# Altium footprint library SWLIB(150721).PcbLib: 348 footprints (part 17 of 22)
Each footprint in its own frame and in the unit in brackets; x right, y up, seen from the top. Pads: shape width x height; smd on the part's side, far side on the other; paste and mask are expansions set on the pad; w line width, h text height; cw(c..) or ccw(c..) is an arc to the next point about the centre after c.
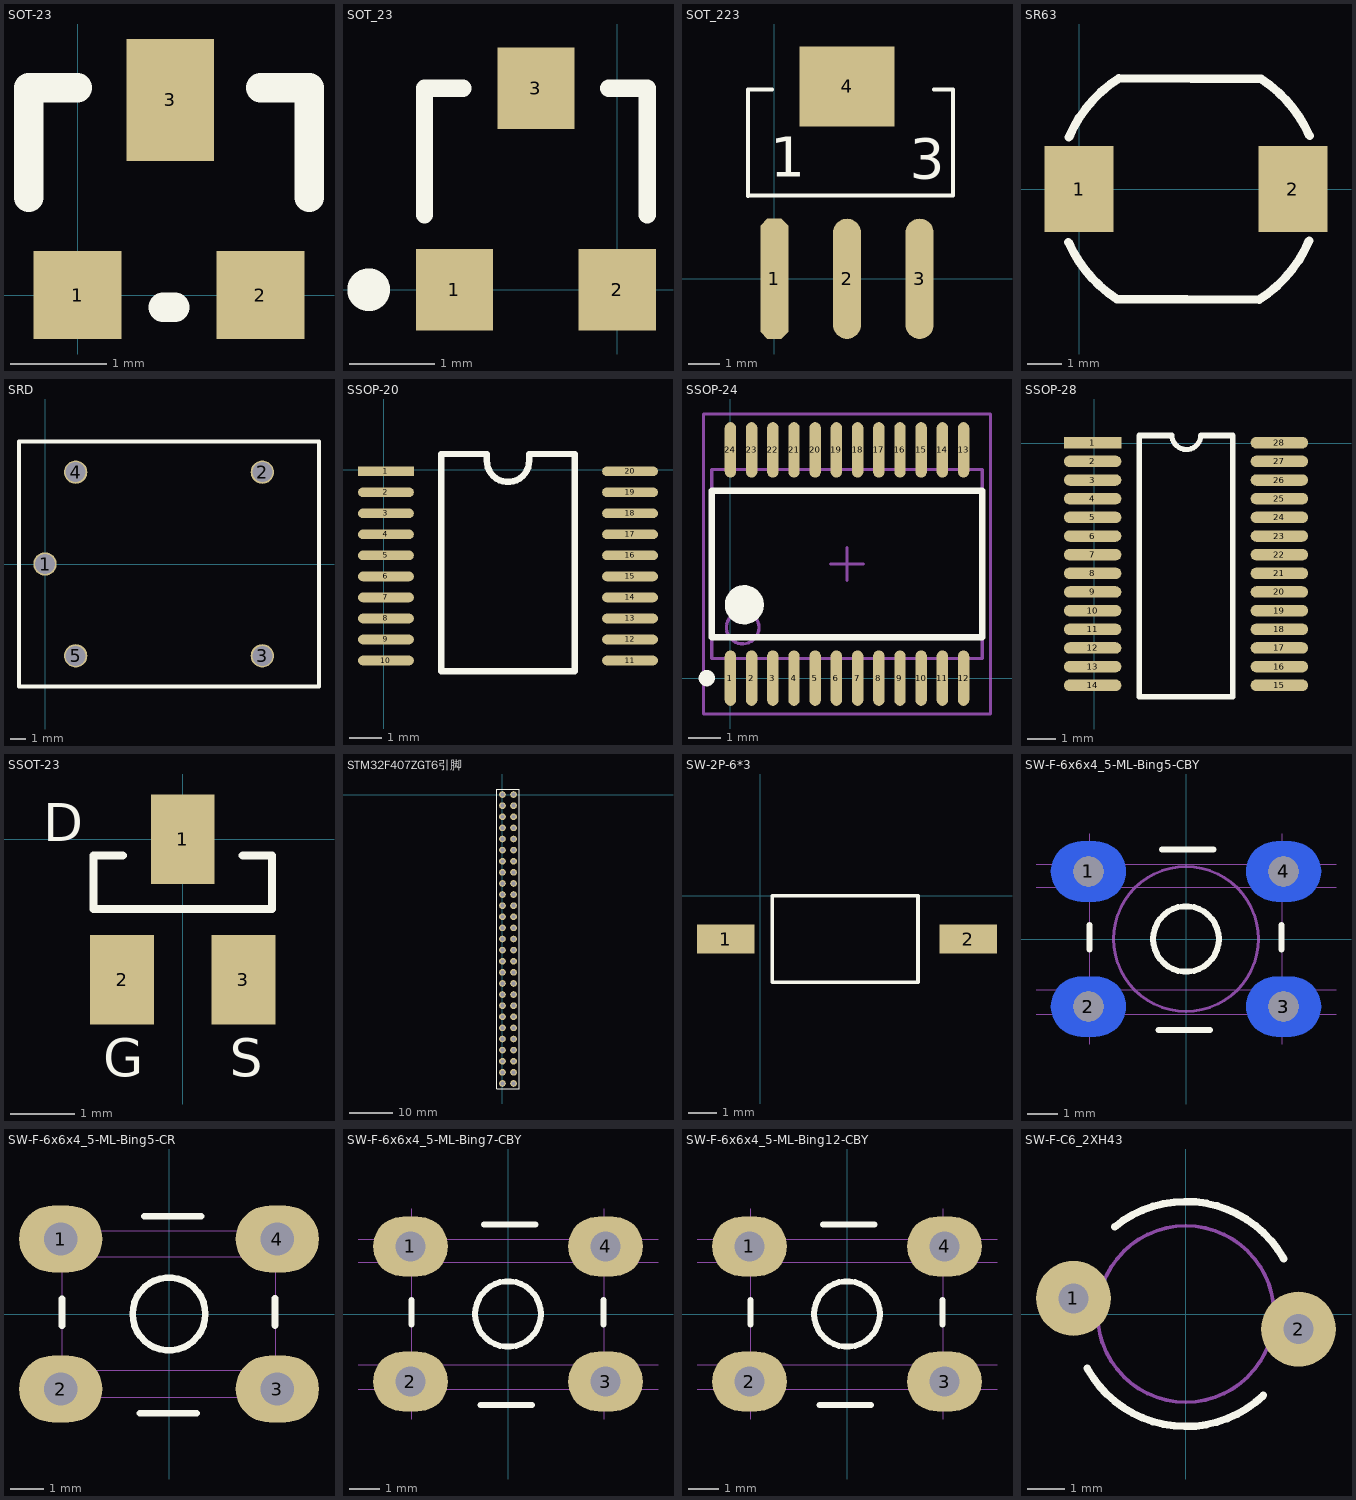
[diagram p16: the footprints below, top view; thin cyan lines are the x and y axes]

## SOT-23 [mil]
pads (3):
  rect 36x36 smd: 1(0,0) 2(75,0)
  rect 36x50 smd: 3(38,80)
Top Overlay:
  lines w12: -20,40 -20,85 0,85 ; 35,-5 40,-5 ; 75,85 95,85 95,40

## SOT_23 [mm]
pads (3):
  rect 0.9x0.95 smd: 1(-1.9,0) 2(0,0) 3(-0.95,2.35)
Top Overlay:
  circle w0.25: c-2.9,0 r0.125
  lines w0.2: -2.25,0.875 -2.25,2.35 -1.8,2.35 ; -0.1,2.35 0.35,2.35 0.35,0.875
3D body "SOT-23-3.STEP": height 1.2, standoff 0, extent -2.428,-0.193 0.472,2.607

## SOT_223 [mm]
pads (4):
  oct 0.889x3.81 smd: 1(0,0)
  oval 0.889x3.81 smd: 2(2.3,0) 3(4.6,0)
  rect 3x2.54 smd: 4(2.3,6.096)
Top Overlay:
  lines w0.127: -0.076,5.994 -0.838,5.994 -0.838,2.616 -0.813,2.642 5.664,2.642 5.664,5.994 5.055,5.994
  text "3" at 4.293,3.175 h1.27
  text "1" at -0.127,3.226 h1.27
3D body "SOT-223_MP04A.STEP": height 1.7, standoff 0, extent -0.837,0.203 5.663,7.163

## SR63 [mil]
pads (2):
  rect 80x100 smd: 1(0,0) 2(248.03,0)
Top Overlay:
  lines w10: -12.42,-61.6 ccw(c126.88,0) 43.69,-127.59 208.93,-128.33 ccw(c126.88,0) 266.88,-60 ; -11.88,60 cw(c128.12,0) 46.07,128.33 211.31,127.59 cw(c128.12,0) 267.42,61.6

## SRD [mm]
pads (5):
  round 1.524 hole 1.3: 1(0,0) 2(14.2,6) 3(14.2,-6) 4(2,6) 5(2,-6)
Top Overlay:
  lines w0.254: -1.7,-8 -1.7,8 17.9,8 17.9,-8 -1.7,-8

## SSOP-20 [mil]
pads (20):
  rect 68x11.81 smd: 1(2.91,-2.05)
  oval 68x11.81 smd: 2(2.91,-27.64) 3(2.91,-53.23) 4(2.91,-78.82) 5(2.91,-104.41) 6(2.91,-130) 7(2.91,-155.59) 8(2.91,-181.18) 9(2.91,-206.77) 10(2.91,-232.36) 11(300,-232.36) 12(300,-206.77) 13(300,-181.18) 14(300,-155.59) 15(300,-130) 16(300,-104.41) 17(300,-78.82) 18(300,-53.23) 19(300,-27.64) 20(300,-2.05)
Top Overlay:
  lines w7.87: 70.16,-245.16 70.16,18.95 125.66,18.95 125.66,10.75 ccw(c151.46,10.75) 177.26,10.75 177.26,18.95 232.76,18.95 232.76,-245.16 70.16,-245.16
3D body "SSOP-20.STEP": height 70.47, standoff -1.97, extent -2.59,-258.74 308.43,28.66

## SSOP-24 [mm]
pads (24):
  oval 0.35x1.7 smd: 1(0,0) 2(0.65,0) 3(1.3,0) 4(1.95,0) 5(2.6,0) 6(3.25,0) 7(3.9,0) 8(4.55,0) 9(5.2,0) 10(5.85,0) 11(6.5,0) 12(7.15,0) 13(7.15,7) 14(6.5,7) 15(5.85,7) 16(5.2,7) 17(4.55,7) 18(3.9,7) 19(3.25,7) 20(2.6,7) 21(1.95,7) 22(1.3,7) 23(0.65,7) 24(0,7)
Top Overlay:
  circle w0.6: c0.425,2.25 r0.3
  circle w0.25: c-0.725,0 r0.125
  lines w0.2: -0.575,1.25 -0.575,5.75 7.725,5.75 7.725,1.25 -0.575,1.25
Mechanical 13:
  circle w0.1: c0.375,1.55 r0.5
  lines w0.1: -0.575,0.6 -0.575,6.4 7.725,6.4 7.725,0.6 -0.575,0.6
Mechanical 15:
  lines w0.1: 3.075,3.5 4.075,3.5 ; 3.575,3 3.575,4 ; -0.825,-1.1 -0.825,8.1 7.975,8.1 7.975,-1.1 -0.825,-1.1
3D body: height 1.6, standoff 0.15, extent -0.575,0.6 7.725,6.4

## SSOP-28 [mm]
pads (28):
  rect 2x0.4 smd: 1(-0.051,0.025)
  oval 2x0.4 smd: 2(-0.051,-0.625) 3(-0.051,-1.275) 4(-0.051,-1.925) 5(-0.051,-2.575) 6(-0.051,-3.225) 7(-0.051,-3.875) 8(-0.051,-4.525) 9(-0.051,-5.175) 10(-0.051,-5.825) 11(-0.051,-6.475) 12(-0.051,-7.125) 13(-0.051,-7.775) 14(-0.051,-8.425) 15(6.451,-8.425) 16(6.451,-7.775) 17(6.451,-7.125) 18(6.451,-6.475) 19(6.451,-5.825) 20(6.451,-5.175) 21(6.451,-4.525) 22(6.451,-3.875) 23(6.451,-3.225) 24(6.451,-2.575) 25(6.451,-1.925) 26(6.451,-1.275) 27(6.451,-0.625) 28(6.451,0.025)
Top Overlay:
  lines w0.178: 2.705,0.296 ccw(c3.213,0.296) 3.72,0.282
  lines w0.2: 2.705,0.274 1.575,0.274 1.575,-8.826 4.826,-8.826 4.826,0.274 3.72,0.274

## SSOT-23 [mm]
pads (3):
  rect 1x1.4 smd: 1(0,0) 2(-0.95,-2.2) 3(0.95,-2.2)
Top Overlay:
  lines w0.127: -0.94,-0.254 -1.397,-0.254 -1.397,-1.092 1.397,-1.092 1.397,-0.254 0.94,-0.254
  text "D" at -2.184,-0.229 h1.02
  text "G" at -1.245,-3.912 h1.02
  text "S" at 0.737,-3.912 h1.02
3D body "SOT-23-3.STEP": height 1.2, standoff 0, extent -1.475,-2.568 1.425,0.232

## STM32F407ZGT6引脚 [mil]
pads (54):
  round 60 hole 35: 1(0,0) 2(100,0) 3(0,-100) 4(100,-100) 5(0,-200) 6(100,-200) 7(0,-300) 8(100,-300) 9(0,-400) 10(100,-400) 11(0,-500) 12(100,-500) 13(0,-600) 14(100,-600) 15(0,-700) 16(100,-700) 17(0,-800) 18(100,-800) 19(0,-900) 20(100,-900) 21(0,-1000) 22(100,-1000) 23(0,-1100) 24(100,-1100) 25(0,-1200) 26(100,-1200) 27(0,-1300) 28(100,-1300) 29(0,-1400) 30(100,-1400) 31(0,-1500) 32(100,-1500) 33(0,-1600) 34(100,-1600) 35(0,-1700) 36(100,-1700) 37(0,-1800) 38(100,-1800) 39(0,-1900) 40(100,-1900) 41(0,-2000) 42(100,-2000) 43(0,-2100) 44(100,-2100) 45(0,-2200) 46(100,-2200) 47(0,-2300) 48(100,-2300) 49(0,-2400) 50(100,-2400) 51(0,-2500) 52(100,-2500) 53(0,-2600) 54(100,-2600)
Top Overlay:
  lines w8: -50,-2650 -50,50 150,50 150,-2650 -50,-2650

## SW-2P-6*3 [mm]
pads (2):
  rect 2x1 smd: 1(-1.2,-1.5) 2(7.2,-1.5)
Top Overlay:
  lines w0.127: 0.406,-3 0.406,0 5.461,0 5.461,-3 0.406,-3

## SW-F-6x6x4_5-ML-Bing5-CBY [mm]
pads (8):
  oval 2.5x2 smd far side mask+0: 1(-3.25,2.25) 2(-3.25,-2.25) 3(3.25,-2.25) 4(3.25,2.25)
  round 1 hole 1: 1(-3.25,2.25) 2(-3.25,-2.25) 3(3.25,-2.25) 4(3.25,2.25)
Top Overlay:
  circle w0.2: c0,0 r1.092
  lines w0.2: -3.21,-0.356 -3.21,0.461 ; -0.914,-3.038 0.798,-3.038 ; -0.796,2.988 0.916,2.988 ; 3.18,-0.345 3.18,0.472
Mechanical 2:
  lines w0.02: -5,-2.5 5,-2.5 ; -5,-1.695 5,-1.695 ; -5,1.722 5,1.722 ; -5,2.5 5,2.5 ; -3.2,-3.5 -3.2,3.5 ; 3.2,-3.5 3.2,3.5
Mechanical 3:
  circle w0.1: c0,0 r2.413
3D body "bing5mm.STEP": height 5, standoff 1, extent -1.651,-1.65 1.649,1.65
3D body "按键脚.STEP": height 1.1, standoff -3.37, extent -3.799,1.755 -2.069,2.505
3D body "按键脚.STEP": height 1.1, standoff -3.37, extent -3.879,-2.498 -2.15,-1.748
3D body "按键脚.STEP": height 1.1, standoff -3.37, extent 2.13,-2.496 3.859,-1.746
3D body "按键脚.STEP": height 1.1, standoff -3.37, extent 2.13,1.713 3.859,2.463
3D body "SW-F-6X6-A-CBE.STEP": height 3.6, standoff 0, extent -3.048,-3.05 3.052,3.05

## SW-F-6x6x4_5-ML-Bing5-CR [mm]
pads (4):
  oval 2.5x2 hole 1: 1(-3.25,2.25) 2(-3.25,-2.25) 3(3.25,-2.25) 4(3.25,2.25)
Top Overlay:
  circle w0.2: c0,0 r1.092
  lines w0.2: -3.21,-0.356 -3.21,0.461 ; -0.879,-2.976 0.833,-2.976 ; -0.746,2.937 0.966,2.937 ; 3.18,-0.345 3.18,0.472
Mechanical 2:
  lines w0.02: -3.985,1.722 3.627,1.722 ; -3.943,-1.695 3.822,-1.695 ; -3.801,-2.5 3.917,-2.5 ; -3.784,2.5 4.385,2.5 ; -3.2,-2.925 -3.2,3.13 ; 3.2,-3.038 3.2,2.781
3D body "SW-F-6X6-A-CBE.STEP": height 3.6, standoff 0, extent -3.048,-3.05 3.052,3.05
3D body "按键脚.STEP": height 1.1, standoff -3.37, extent -3.799,1.755 -2.069,2.505
3D body "按键脚.STEP": height 1.1, standoff -3.37, extent -3.879,-2.498 -2.15,-1.748
3D body "按键脚.STEP": height 1.1, standoff -3.37, extent 2.13,-2.496 3.859,-1.746
3D body "按键脚.STEP": height 1.1, standoff -3.37, extent 2.13,1.713 3.859,2.463
3D body "bing5mm-CR.STEP": height 5, standoff 1, extent -1.651,-1.65 1.649,1.65

## SW-F-6x6x4_5-ML-Bing7-CBY [mm]
pads (4):
  oval 2.5x2 hole 1: 1(-3.25,2.25) 2(-3.25,-2.25) 3(3.25,-2.25) 4(3.25,2.25)
Top Overlay:
  circle w0.2: c0,0 r1.092
  lines w0.2: -3.21,-0.356 -3.21,0.461 ; -0.914,-3.038 0.798,-3.038 ; -0.796,2.988 0.916,2.988 ; 3.18,-0.345 3.18,0.472
Mechanical 2:
  lines w0.02: -5,-2.5 5,-2.5 ; -5,-1.695 5,-1.695 ; -5,1.722 5,1.722 ; -5,2.5 5,2.5 ; -3.2,-3.5 -3.2,3.5 ; 3.2,-3.5 3.2,3.5
3D body "按键脚.STEP": height 1.1, standoff -3.37, extent -3.799,1.755 -2.069,2.505
3D body "按键脚.STEP": height 1.1, standoff -3.37, extent -3.879,-2.498 -2.15,-1.748
3D body "按键脚.STEP": height 1.1, standoff -3.37, extent 2.13,-2.496 3.859,-1.746
3D body "按键脚.STEP": height 1.1, standoff -3.37, extent 2.13,1.713 3.859,2.463
3D body "SW-F-6X6-A-CBE.STEP": height 3.6, standoff 0, extent -3.042,-3.075 3.058,3.025
3D body "bing7mm.STEP": height 7, standoff 1, extent -1.651,-1.65 1.649,1.65

## SW-F-6x6x4_5-ML-Bing12-CBY [mm]
pads (4):
  oval 2.5x2 hole 1: 1(-3.25,2.25) 2(-3.25,-2.25) 3(3.25,-2.25) 4(3.25,2.25)
Top Overlay:
  circle w0.2: c0,0 r1.092
  lines w0.2: -3.21,-0.356 -3.21,0.461 ; -0.914,-3.038 0.798,-3.038 ; -0.796,2.988 0.916,2.988 ; 3.18,-0.345 3.18,0.472
Mechanical 2:
  lines w0.02: -5,-2.5 5,-2.5 ; -5,-1.695 5,-1.695 ; -5,1.722 5,1.722 ; -5,2.5 5,2.5 ; -3.2,-3.5 -3.2,3.5 ; 3.2,-3.5 3.2,3.5
3D body "bing9mm.STEP": height 9, standoff 1, extent -1.651,-1.65 1.649,1.65
3D body "按键脚.STEP": height 1.1, standoff -3.37, extent -3.799,1.755 -2.069,2.505
3D body "按键脚.STEP": height 1.1, standoff -3.37, extent -3.879,-2.498 -2.15,-1.748
3D body "按键脚.STEP": height 1.1, standoff -3.37, extent 2.13,-2.496 3.859,-1.746
3D body "按键脚.STEP": height 1.1, standoff -3.37, extent 2.13,1.713 3.859,2.463
3D body "SW-F-6X6-A-CBE.STEP": height 3.6, standoff 0, extent -3.042,-3.075 3.058,3.025

## SW-F-C6_2XH43 [mm]
pads (2):
  round 2 hole 0.8 mask+0: 1(-2.995,0.416) 2(3.006,-0.406)
Top Overlay:
  lines w0.2: -2.626,-1.45 ccw(c0,0) 2.07,-2.172 ; -1.897,2.324 cw(c0,0) 2.613,1.473
Mechanical 3:
  circle w0.1: c0,0 r2.352
3D body "C6_2X3_6XH4_3-CX.STEP": height 3.7, standoff 0, extent -3.12,-3.092 3.08,3.108
3D body "C6_2X3_6XH4_3-bing.STEP": height 4.3, standoff 2.3, extent -1.671,-1.637 1.629,1.663
3D body "C6_2X3_6XH4_3-zao.STEP": height 2.25, standoff -3, extent -3.326,0.168 3.274,0.668
3D body "C6_2X3_6XH4_3-zao.STEP": height 2.25, standoff -3, extent -3.318,-0.673 3.282,-0.173